# Altium footprint library 学习.PcbLib: 96 footprints (part 5 of 6)
Each footprint in its own frame and in the unit in brackets; x right, y up, seen from the top. Pads: shape width x height; smd on the part's side, far side on the other; paste and mask are expansions set on the pad; w line width, h text height; cw(c..) or ccw(c..) is an arc to the next point about the centre after c.
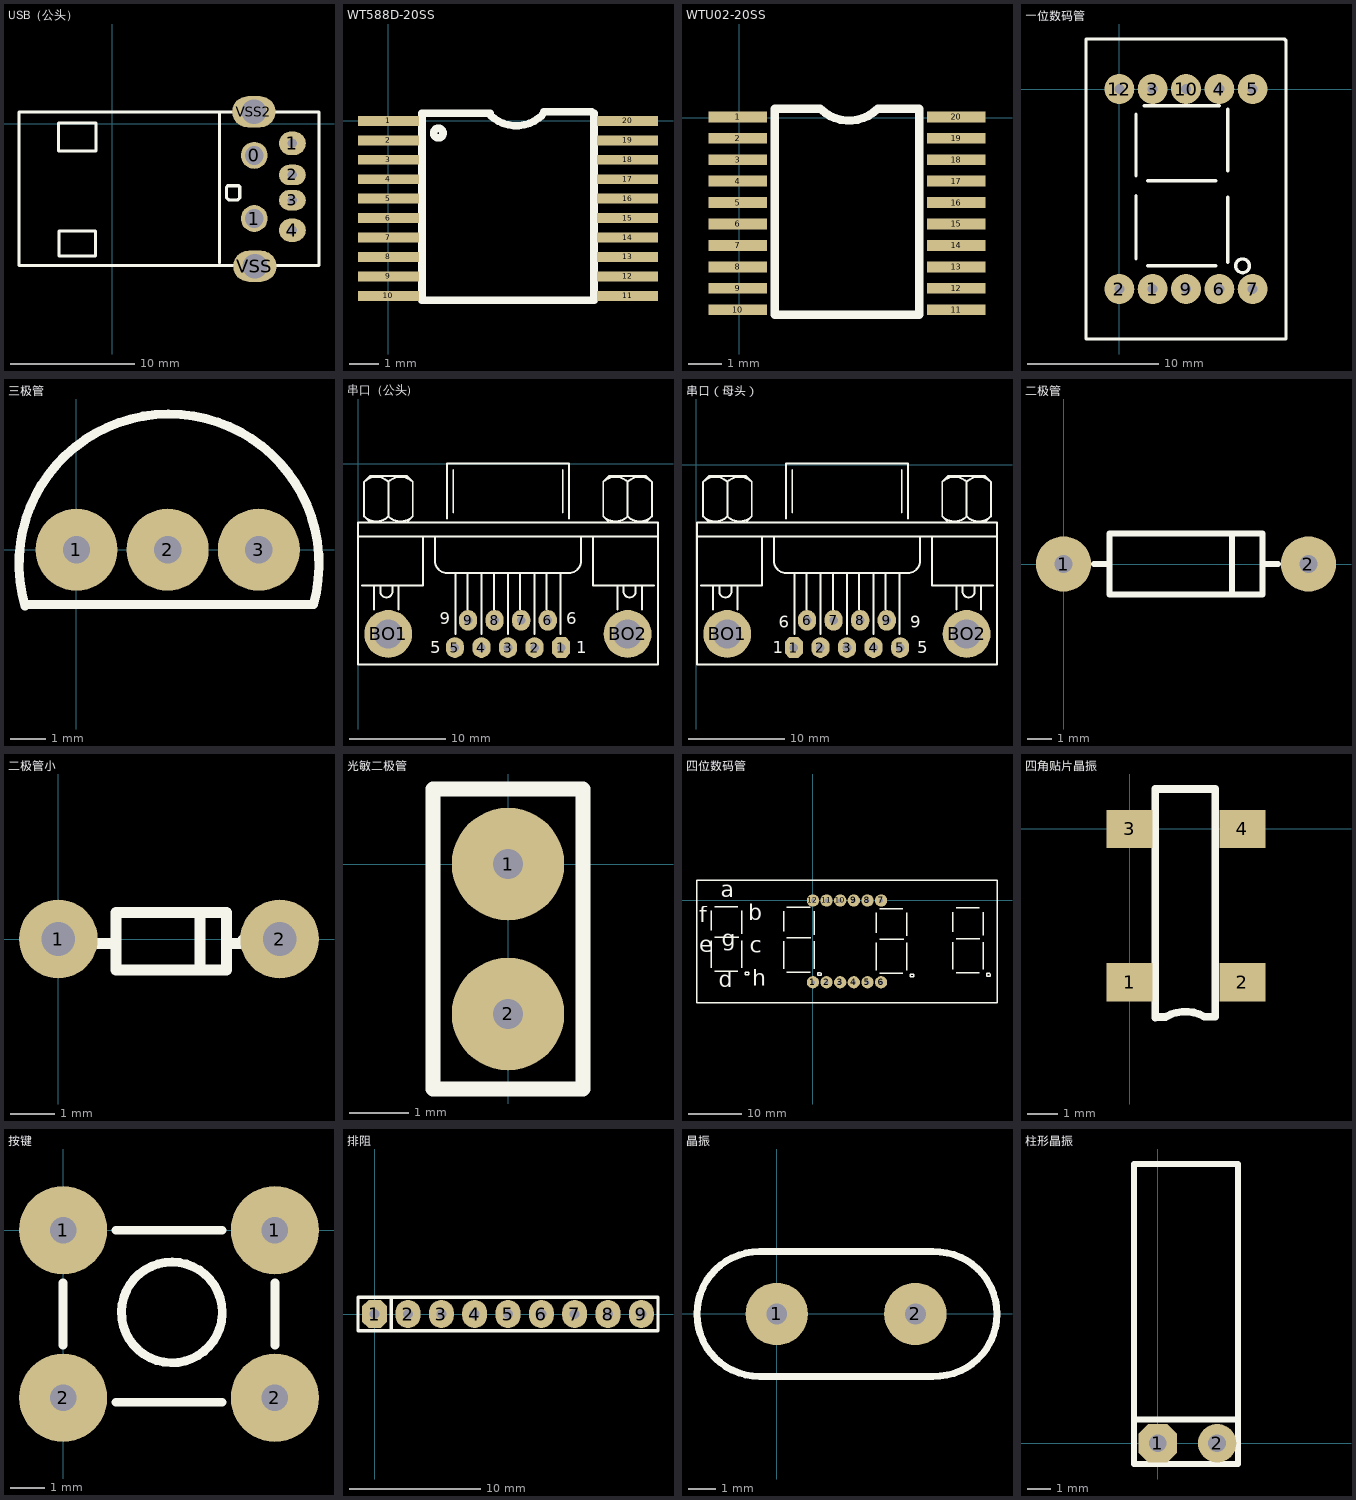
[diagram p4: the footprints below, top view; thin cyan lines are the x and y axes]

## USB（公头） [mil]
pads (8):
  round 85 hole 60: 0(450,-100) 1(450,-300)
  oval 85x75 hole 30 paste+0: 1(570.63,-62.09) 4(570.63,-337.09)
  oval 85x65 hole 30: 2(570.63,-162.09) 3(570.63,-242.09)
  oval 137.79x98.42 hole 78.74: VSS(452,-451) VSS2(449,38)
Top Overlay:
  lines w10: 340,-440 340,35 ; -295,-449 -295,37 655,37 655,-449 -295,-449 ; -170,-86 -170,3 -51,3 -51,-86 -170,-86 ; -168,-419 -168,-339 -53,-339 -53,-419 -168,-419 ; 362,-234 362,-200 366,-196 401,-196 404,-199 404,-235 398,-241 369,-241 362,-234

## WT588D-20SS [mil]
pads (20):
  rect 80x13 smd: 1(0,0) 2(0,-25.59) 3(0,-51.18) 4(0,-76.77) 5(0,-102.36) 6(0,-127.95) 7(0,-153.54) 8(0,-179.13) 9(0,-204.72) 10(0,-230.31) 11(314.96,-230.31) 12(314.96,-204.72) 13(314.96,-179.13) 14(314.96,-153.54) 15(314.96,-127.95) 16(314.96,-102.36) 17(314.96,-76.77) 18(314.96,-51.18) 19(314.96,-25.59) 20(314.96,0)
Top Overlay:
  lines w10: 65.67,-9.72 cw(c65.78,-16) 59.63,-17.25 ; 133.86,7.87 ccw(c168.31,42.32) 202.76,7.87 ; 133.86,9.84 44.29,9.84 44.29,-236.22 267.72,-236.22 ; 204.72,11.81 267.72,11.81 ; 270.67,-236.22 270.67,9.84 ; 59.63,-17.25 ccw(c65.78,-16) 59.63,-17.25

## WTU02-20SS [mil]
pads (20):
  rect 70x13 smd: 1(-1.97,0.98) 2(-1.97,-24.61) 3(-1.97,-50.2) 4(-1.97,-75.79) 5(-1.97,-101.38) 6(-1.97,-126.97) 7(-1.97,-152.56) 8(-1.97,-178.15) 9(-1.97,-203.74) 10(-1.97,-229.33) 11(258.86,-229.33) 12(258.86,-203.74) 13(258.86,-178.15) 14(258.86,-152.56) 15(258.86,-126.97) 16(258.86,-101.38) 17(258.86,-75.79) 18(258.86,-50.2) 19(258.86,-24.61) 20(258.86,0.98)
Top Overlay:
  lines w10: 95.47,10.83 42.32,10.83 42.32,-235.24 214.57,-235.24 214.57,10.83 175.2,10.83 165.35,10.83 cw(c130.91,45.28) 96.46,10.83

## 一位数码管 [mil]
pads (10):
  round 90 hole 30 paste+0: 1(100,-600) 2(0,-600) 3(100,0) 4(300,0) 5(400,0) 6(300,-600) 7(400,-600) 9(200,-600) 10(200,0) 12(0,0)
Top Overlay:
  lines w10: 50,-510 50,-320 ; 50,-260 50,-75 ; 75,-50 300,-50 ; 85,-530 290,-530 ; 85,-275 290,-275 ; 325,-520 325,-325 ; 325,-245 325,-60 ; 349.58,-535.42 cw(c369.58,-530.42) 351.06,-539.48 ; -100,-750 500,-750 500,145 495,150 -100,150 -100,-750

## 三极管 [mil]
pads (3):
  round 90 hole 30: 1(0,0) 2(100,0) 3(200,0)
Top Overlay:
  lines w10: -56.54,-61.57 cw(c101.51,-15.69) 260,-60 -56.54,-60

## 串口（公头) [mil]
pads (11):
  oct 75x85 hole 35: 1(833.75,-755.83)
  oval 75x85 hole 35: 2(724.58,-755.83) 3(615.42,-755.83) 4(506.25,-755.83) 5(397.08,-755.83) 6(778.75,-644.17) 7(669.58,-644.17) 8(560.42,-644.17) 9(451.25,-644.17)
  round 196.67 hole 118.33: BO1(122.92,-700) BO2(1107.08,-700)
Top Overlay:
  lines w8: -1.25,-300 1232.08,-300 ; 15.42,-500 265.42,-500 265.42,-300 ; 23.66,-216.75 ccw(c73.75,-166.67) 123.84,-216.75 ; 23.66,-74.91 cw(c73.75,-125) 123.84,-74.91 ; 48.75,-241.67 23.75,-216.67 23.75,-75 48.75,-50 198.75,-50 223.75,-75 223.75,-216.67 198.75,-241.67 ; 65.42,-600 65.42,-500 ; 90.42,-500 90.42,-525 ccw(c115.42,-525) 140.42,-525 140.42,-500 ; 123.66,-216.75 ccw(c173.75,-166.67) 223.84,-216.75 ; 123.66,-74.91 cw(c173.75,-125) 223.84,-74.91 ; 123.75,-216.67 123.75,-75 ; 165.42,-600 165.42,-500 ; 315.42,-300 315.42,-400 ccw(c365.42,-400) 365.42,-450 865.42,-450 ccw(c865.42,-400) 915.42,-400 915.42,-300 ; 365.42,-225 365.42,0 865.42,0 865.42,-225 ; 390.42,-200 390.42,-25 ; 398.75,-700 398.75,-450 ; 448.75,-600 448.75,-450 ; 507.08,-700 507.08,-450 ; 557.08,-600 557.08,-450 ; 615.42,-700 615.42,-450 ; 665.42,-600 665.42,-450 ; 723.75,-700 723.75,-450 ; 773.75,-600 773.75,-450 ; 832.08,-700 832.08,-450 ; 840.42,-200 840.42,-25 ; 965.42,-300 965.42,-500 1215.42,-500 ; 1007,-216.75 ccw(c1057.08,-166.67) 1107.17,-216.75 ; 1007,-74.91 cw(c1057.08,-125) 1107.17,-74.91 ; 1032.08,-241.67 1007.08,-216.67 1007.08,-75 1032.08,-50 1182.08,-50 1207.08,-75 1207.08,-216.67 1182.08,-241.67 ; 1065.42,-600 1065.42,-500 ; 1090.42,-500 1090.42,-525 ccw(c1115.42,-525) 1140.42,-525 1140.42,-500 ; 1107,-216.75 ccw(c1157.08,-166.67) 1207.17,-216.75 ; 1107,-74.91 cw(c1157.08,-125) 1207.17,-74.91 ; 1107.08,-216.67 1107.08,-75 ; 1165.42,-600 1165.42,-500 ; -1.25,-825 1232.08,-825 1232.08,-241.67 -1.25,-241.67 -1.25,-825
  text "6" at 855.42,-660 h50
  text "1" at 895.42,-780 h50
  text "5" at 295.42,-780 h50
  text "9" at 335.42,-660 h50

## 串口（母头） [mil]
pads (11):
  oct 75x85 hole 35: 1(402.08,-750.83)
  oval 75x85 hole 35: 2(511.25,-750.83) 3(620.42,-750.83) 4(729.58,-750.83) 5(838.75,-750.83) 6(456.25,-639.17) 7(565.42,-639.17) 8(674.58,-639.17) 9(783.75,-639.17)
  round 196.67 hole 118.33: BO1(127.92,-695) BO2(1112.08,-695)
Top Overlay:
  lines w8: 3.75,-295 1237.08,-295 ; 20.42,-495 270.42,-495 270.42,-295 ; 28.66,-211.75 ccw(c78.75,-161.67) 128.84,-211.75 ; 28.66,-69.91 cw(c78.75,-120) 128.84,-69.91 ; 53.75,-236.67 28.75,-211.67 28.75,-70 53.75,-45 203.75,-45 228.75,-70 228.75,-211.67 203.75,-236.67 ; 70.42,-595 70.42,-495 ; 95.42,-495 95.42,-520 ccw(c120.42,-520) 145.42,-520 145.42,-495 ; 128.66,-211.75 ccw(c178.75,-161.67) 228.84,-211.75 ; 128.66,-69.91 cw(c178.75,-120) 228.84,-69.91 ; 128.75,-211.67 128.75,-70 ; 170.42,-595 170.42,-495 ; 320.42,-295 320.42,-395 ccw(c370.42,-395) 370.42,-445 870.42,-445 ccw(c870.42,-395) 920.42,-395 920.42,-295 ; 370.42,-220 370.42,5 870.42,5 870.42,-220 ; 395.42,-195 395.42,-20 ; 403.75,-695 403.75,-445 ; 453.75,-595 453.75,-445 ; 512.08,-695 512.08,-445 ; 562.08,-595 562.08,-445 ; 620.42,-695 620.42,-445 ; 670.42,-595 670.42,-445 ; 728.75,-695 728.75,-445 ; 778.75,-595 778.75,-445 ; 837.08,-695 837.08,-445 ; 845.42,-195 845.42,-20 ; 970.42,-295 970.42,-495 1220.42,-495 ; 1012,-211.75 ccw(c1062.08,-161.67) 1112.17,-211.75 ; 1012,-69.91 cw(c1062.08,-120) 1112.17,-69.91 ; 1037.08,-236.67 1012.08,-211.67 1012.08,-70 1037.08,-45 1187.08,-45 1212.08,-70 1212.08,-211.67 1187.08,-236.67 ; 1070.42,-595 1070.42,-495 ; 1095.42,-495 1095.42,-520 ccw(c1120.42,-520) 1145.42,-520 1145.42,-495 ; 1112,-211.75 ccw(c1162.08,-161.67) 1212.17,-211.75 ; 1112,-69.91 cw(c1162.08,-120) 1212.17,-69.91 ; 1112.08,-211.67 1112.08,-70 ; 1170.42,-595 1170.42,-495 ; 3.75,-820 1237.08,-820 1237.08,-236.67 3.75,-236.67 3.75,-820
  text "6" at 340,-670 h50
  text "1" at 315,-775 h50
  text "5" at 910,-775 h50
  text "9" at 880,-670 h50

## 二极管 [mil]
pads (2):
  round 90 hole 30: 1(0,0) 2(400,0)
Top Overlay:
  lines w10: 50,0 75,0 ; 275,-50 275,50 ; 325,0 350,0 ; 75,-50 75,50 325,50 325,-50 75,-50

## 二极管小 [mil]
pads (2):
  round 70 hole 30: 1(0,0) 2(196.85,0)
Top Overlay:
  lines w10: 35.43,-3.94 51.18,-3.94 ; 125.98,-27.56 125.98,23.62 ; 149.61,-3.94 161.42,-3.94 165.35,0 ; 51.18,-27.56 149.61,-27.56 149.61,23.62 51.18,23.62 51.18,-27.56

## 光敏二极管 [mil]
pads (2):
  round 75 hole 20: 1(0,0) 2(0,-100)
Top Overlay:
  lines w10: -50,-150 -50,50 50,50 50,-150 -50,-150

## 四位数码管 [mil]
pads (12):
  round 90 hole 30: 1(0,-600) 2(100,-600) 3(200,-600) 4(300,-600) 5(400,-600) 6(500,-600) 7(500,0) 8(400,0) 9(300,0) 10(200,0) 11(100,0) 12(0,0)
Top Overlay:
  lines w10: -745,-495 -745,-295 ; -745,-220 -745,-75 ; -720,-520 -550,-520 ; -720,-270 -545,-270 ; -720,-45 -550,-45 ; -520,-495 -520,-295 ; -520,-245 -520,-75 ; -215,-500 -215,-300 ; -215,-225 -215,-80 ; -190,-525 -20,-525 ; -190,-275 -15,-275 ; -190,-50 -20,-50 ; 10,-500 10,-300 ; 10,-250 10,-80 ; 465,-510 465,-310 ; 465,-235 465,-90 ; 490,-535 660,-535 ; 490,-285 665,-285 ; 490,-60 660,-60 ; 690,-510 690,-310 ; 690,-260 690,-90 ; 1025,-505 1025,-305 ; 1025,-230 1025,-85 ; 1050,-530 1220,-530 ; 1050,-280 1225,-280 ; 1050,-55 1220,-55 ; 1250,-505 1250,-305 ; 1250,-255 1250,-85 ; -850,-750 1350,-750 1350,150 -850,150 -850,-750 ; -495,-545 -470,-545 -470,-530 -475,-525 -495,-525 -495,-545 ; 35,-550 60,-550 60,-535 55,-530 35,-530 35,-550 ; 715,-560 740,-560 740,-545 735,-540 715,-540 715,-560 ; 1275,-555 1300,-555 1300,-540 1295,-535 1275,-535 1275,-555
  text "h" at -445,-665 h200
  text "g" at -670,-375 h200
  text "f" at -835,-195 h200
  text "e" at -835,-420 h200
  text "d" at -690,-675 h200
  text "c" at -465,-425 h200
  text "b" at -475,-185 h200
  text "a" at -675,-15 h200

## 四角贴片晶振 [mil]
pads (4):
  rect 60x50 smd: 1(0,-200.79) 2(147.64,-200.79) 3(0,0) 4(147.64,0)
Top Overlay:
  lines w10: 33.46,-247.05 33.46,52.17 112.2,52.17 112.2,-104.33 112.2,-246.06 98.43,-246.06 ccw(c72.83,-289.82) 46.92,-246.25 34.26,-246.25

## 按键 [mil]
pads (4):
  round 100 hole 30: 1(0,0) 1(240,0) 2(0,-190) 2(240,-190)
Top Overlay:
  lines w10: 0,-130 0,-60 ; 60,-195 180,-195 ; 60,0 180,0 ; 180.38,-95.01 cw(c123.29,-93.19) 180.41,-93.19 ; 240,-130 240,-60

## 排阻 [mil]
pads (9):
  oct 75x85 hole 30: 1(0,0)
  oval 75x85 hole 30: 2(100,0) 3(200,0) 4(300,0) 5(400,0) 6(500,0) 7(600,0) 8(700,0) 9(800,0)
Top Overlay:
  lines w10: 50,-50 50,50 ; -50,-50 -50,50 850,50 850,-50 -50,-50

## 晶振 [mil]
pads (2):
  round 90 hole 30: 1(0,0) 2(200,0)
Top Overlay:
  lines w10: 225.31,89.93 cw(c227.75,-0.04) 225.27,-90 -25,-90 cw(c-25,0) -25,90 225.31,90

## 柱形晶振 [mil]
pads (2):
  oct 65x65 hole 30: 1(0,0)
  round 65 hole 30: 2(100,0)
Top Overlay:
  lines w10: -40,40 135,40 ; -40,-35 -40,471.46 135,471.46 135,-35 -40,-35